# Altium footprint library TranDangKhoa-LIB.PcbLib: 1435 footprints (part 7 of 90)
Each footprint in its own frame and in the unit in brackets; x right, y up, seen from the top. Pads: shape width x height; smd on the part's side, far side on the other; paste and mask are expansions set on the pad; w line width, h text height; cw(c..) or ccw(c..) is an arc to the next point about the centre after c.
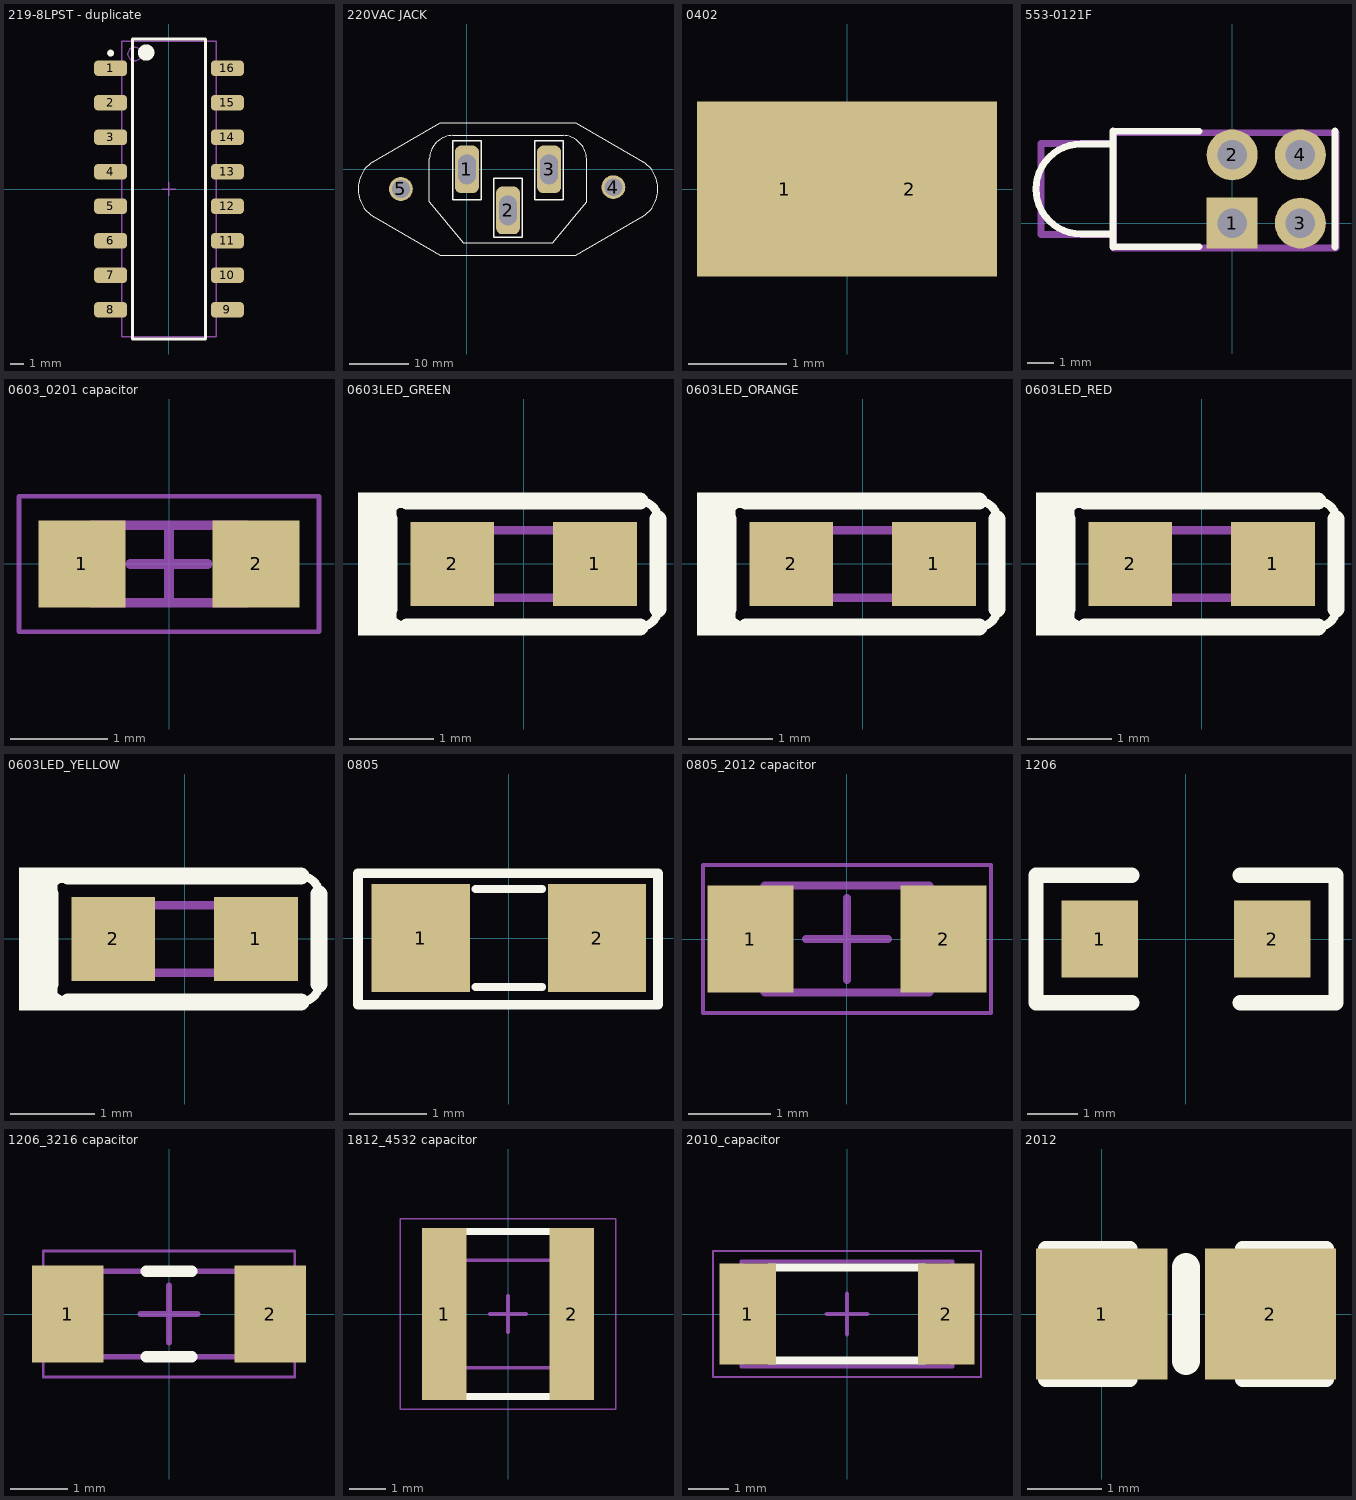
[diagram p6: the footprints below, top view; thin cyan lines are the x and y axes]

## 219-8LPST - duplicate [mm] "Surface Mount DIP Switch, 8-way, Gull Wing Leads"
height 3.85
pads (16):
  rrect50% 2.44x1.13 smd mask+0: 1(-4.3,8.89) 2(-4.3,6.35) 3(-4.3,3.81) 4(-4.3,1.27) 5(-4.3,-1.27) 6(-4.3,-3.81) 7(-4.3,-6.35) 8(-4.3,-8.89)
  rrect50% 2.44x1.13 smd: 9(4.3,-8.89) 10(4.3,-6.35) 11(4.3,-3.81) 12(4.3,-1.27) 13(4.3,1.27) 14(4.3,3.81) 15(4.3,6.35) 16(4.3,8.89)
Top Overlay:
  circle w0.25: c-4.3,10.005 r0.125
  circle w0.6: c-1.68,10.045 r0.3
  lines w0.2: -2.68,-11.045 -2.68,11.045 2.68,11.045 2.68,-11.045 -2.68,-11.045
Mechanical 13:
  circle w0.1: c-2.525,9.945 r0.5
  lines w0.1: -3.475,-10.895 -3.475,10.895 3.475,10.895 3.475,-10.895 -3.475,-10.895
Mechanical 15:
  lines w0.1: -0.5,0 0.5,0 ; 0,-0.5 0,0.5
3D body "dipswitch254.stp": height 3.37, standoff -0.14, extent -5.103,-11.404 5.08,11.404

## 220VAC JACK [mm]
pads (5):
  rrect50% 4x8 hole 3 slot 5 at 90 deg: 1(0,0) 2(6.903,-6.903) 3(13.807,0)
  round 4 hole 3: 4(24.612,-3.001) 5(-11.105,-3.302)
Top Overlay:
  lines w0.2: -15.923,-7.804 -4.486,-14.407 ; -15.923,1.201 -4.486,7.804 ; -15.908,-7.804 cw(c-12.887,-3.302) -15.908,1.201 ; -4.502,-14.407 18.309,-14.407 ; -4.502,7.804 18.309,7.804 ; 18.293,-14.406 29.73,-7.803 ; 18.293,7.804 29.73,1.201 ; 29.714,-7.804 ccw(c26.694,-3.302) 29.714,1.201 ; -6.303,-5.403 -6.303,1.801 cw(c-2.251,1.651) -2.401,5.703 16.208,5.703 cw(c15.997,1.59) 20.11,1.801 20.11,-5.403 14.407,-12.306 -0.6,-12.306 -6.303,-5.403
  lines w0.254: -2.401,-5.102 2.401,-5.102 2.401,4.802 -2.401,4.802 -2.401,-5.102 ; 4.502,-11.405 9.304,-11.405 9.304,-1.501 4.502,-1.501 4.502,-11.405 ; 11.405,-5.102 16.208,-5.102 16.208,4.802 11.405,4.802 11.405,-5.102

## 0402 [mil]
pads (2):
  rect 70x70 smd: 1(-25,0) 2(25,0)
Top Overlay:
  lines w4: -41.25,-9.25 -37,-13.5 41.25,-13.5 41.25,13.5 -37.5,13.5 -41.25,9.75 -41.25,-9.25

## 553-0121F [mm]
pads (4):
  rect 1.9x1.9 hole 1.1: 1(0,0)
  round 1.9 hole 1.1: 2(0,2.54) 3(2.54,0) 4(2.54,2.54)
Top Overlay:
  lines w0.254: -4.445,-0.889 -4.445,3.429 ; -4.445,-0.406 -5.639,-0.406 cw(c-5.639,1.27) -5.639,2.946 -4.445,2.946 ; -4.43,-0.88 -1.23,-0.88 ; -4.43,3.42 -1.23,3.42 ; 3.833,-0.889 3.833,3.429
Mechanical 16:
  lines w0.254: -4.43,-0.43 -7.13,-0.43 -7.13,2.97 -4.43,2.97 ; -4.43,-0.93 -4.43,3.37 3.87,3.37 3.87,-0.93 -4.43,-0.93
Mechanical 29:
  text ".Designator" at -2.5,0.5 h1.52
3D body "55307XXF.stp": height 9.65, standoff -3.68, extent -7.28,-0.898 3.718,3.42

## 0603_0201 capacitor [mm] "Chip Capacitor, 2-Leads, Body 1.60x0.80mm, IPC Medium Density"
height 0.8
pads (2):
  rect 0.9x0.9 smd: 1(-0.9,0) 2(0.9,0)
Mechanical 13:
  lines w0.1: -0.8,-0.4 -0.8,0.4 0.8,0.4 0.8,-0.4 -0.8,-0.4
Mechanical 15:
  lines w0.05: -1.55,-0.7 -1.55,0.7 1.55,0.7 1.55,-0.7 -1.55,-0.7
  lines w0.1: -0.4,0 0.4,0 ; 0,-0.4 0,0.4
3D body: height 0.8, standoff 0, extent -0.4,-0.4 0.4,0.4
3D body: height 0.8, standoff 0, extent -0.8,-0.4 -0.4,0.4
3D body: height 0.8, standoff 0, extent 0.4,-0.4 0.8,0.4

## 0603LED_GREEN [mm]
pads (2):
  rect 1x1 smd paste+0 mask+0: 1(0.85,0) 2(-0.85,0)
Top Overlay:
  rectangle: -1.782,0.665 -1.132,0.851
  rectangle: -1.973,-0.851 -1.516,0.851
  rectangle: -1.782,-0.851 -1.198,-0.686
  lines w0.102: -1.602,-0.533 ccw(c-1.386,-0.533) -1.386,-0.749 ; -1.602,0.533 cw(c-1.386,0.533) -1.386,0.749 ; 1.386,-0.749 ccw(c1.386,-0.533) 1.602,-0.533 ; 1.386,0.749 cw(c1.386,0.533) 1.602,0.533
  lines w0.203: -1.602,-0.533 -1.602,0.533 ; -1.386,-0.749 1.386,-0.749 ; -1.386,0.749 1.386,0.749 ; 1.602,-0.533 1.602,0.533
Mechanical 7:
  lines w0.1: -0.8,-0.4 0.8,-0.4 0.8,0.4 -0.8,0.4 -0.8,-0.4
  text ".Comment" at -1.6,-0.9 h0.4
  text ".Designator" at -1.6,0.6 h0.4
3D body: height 0.38, standoff 0, extent 0.664,-0.532 1.089,0.532
3D body: height 0.38, standoff 0, extent -0.925,-0.535 -0.5,0.535
3D body: height 0.38, standoff 0, extent -0.502,-0.533 0.668,0.533
3D body: height 0.46, standoff 0, extent -0.301,-0.464 0.493,0.402

## 0603LED_ORANGE [mm]
pads (2):
  rect 1x1 smd paste+0 mask+0: 1(0.85,0) 2(-0.85,0)
Top Overlay:
  rectangle: -1.782,-0.851 -1.198,-0.686
  rectangle: -1.973,-0.851 -1.516,0.851
  rectangle: -1.782,0.665 -1.132,0.851
  lines w0.102: -1.602,-0.533 ccw(c-1.386,-0.533) -1.386,-0.749 ; -1.602,0.533 cw(c-1.386,0.533) -1.386,0.749 ; 1.386,-0.749 ccw(c1.386,-0.533) 1.602,-0.533 ; 1.386,0.749 cw(c1.386,0.533) 1.602,0.533
  lines w0.203: -1.602,-0.533 -1.602,0.533 ; -1.386,-0.749 1.386,-0.749 ; -1.386,0.749 1.386,0.749 ; 1.602,-0.533 1.602,0.533
Mechanical 7:
  lines w0.1: -0.8,-0.4 0.8,-0.4 0.8,0.4 -0.8,0.4 -0.8,-0.4
  text ".Designator" at -1.6,0.6 h0.4
  text ".Comment" at -1.6,-0.9 h0.4
3D body: height 0.38, standoff 0, extent 0.664,-0.532 1.089,0.532
3D body: height 0.38, standoff 0, extent -0.925,-0.535 -0.5,0.535
3D body: height 0.38, standoff 0, extent -0.502,-0.533 0.668,0.533
3D body: height 0.46, standoff 0, extent -0.301,-0.464 0.493,0.402

## 0603LED_RED [mm]
pads (2):
  rect 1x1 smd paste+0 mask+0: 1(0.85,0) 2(-0.85,0)
Top Overlay:
  rectangle: -1.782,-0.851 -1.198,-0.686
  rectangle: -1.973,-0.851 -1.516,0.851
  rectangle: -1.782,0.665 -1.132,0.851
  lines w0.102: -1.602,-0.533 ccw(c-1.386,-0.533) -1.386,-0.749 ; -1.602,0.533 cw(c-1.386,0.533) -1.386,0.749 ; 1.386,-0.749 ccw(c1.386,-0.533) 1.602,-0.533 ; 1.386,0.749 cw(c1.386,0.533) 1.602,0.533
  lines w0.203: -1.602,-0.533 -1.602,0.533 ; -1.386,-0.749 1.386,-0.749 ; -1.386,0.749 1.386,0.749 ; 1.602,-0.533 1.602,0.533
Mechanical 7:
  lines w0.1: -0.8,-0.4 0.8,-0.4 0.8,0.4 -0.8,0.4 -0.8,-0.4
  text ".Designator" at -1.6,0.6 h0.4
  text ".Comment" at -1.6,-0.9 h0.4
3D body: height 0.38, standoff 0, extent 0.664,-0.532 1.089,0.532
3D body: height 0.38, standoff 0, extent -0.925,-0.535 -0.5,0.535
3D body: height 0.38, standoff 0, extent -0.502,-0.533 0.668,0.533
3D body: height 0.46, standoff 0, extent -0.301,-0.464 0.493,0.402

## 0603LED_YELLOW [mm]
pads (2):
  rect 1x1 smd paste+0 mask+0: 1(0.85,0) 2(-0.85,0)
Top Overlay:
  rectangle: -1.782,0.665 -1.132,0.851
  rectangle: -1.973,-0.851 -1.516,0.851
  rectangle: -1.782,-0.851 -1.198,-0.686
  lines w0.102: -1.602,-0.533 ccw(c-1.386,-0.533) -1.386,-0.749 ; -1.602,0.533 cw(c-1.386,0.533) -1.386,0.749 ; 1.386,-0.749 ccw(c1.386,-0.533) 1.602,-0.533 ; 1.386,0.749 cw(c1.386,0.533) 1.602,0.533
  lines w0.203: -1.602,-0.533 -1.602,0.533 ; -1.386,-0.749 1.386,-0.749 ; -1.386,0.749 1.386,0.749 ; 1.602,-0.533 1.602,0.533
Mechanical 7:
  lines w0.1: -0.8,-0.4 -0.8,0.4 0.8,0.4 0.8,-0.4 -0.8,-0.4
  text ".Comment" at -1.6,-0.9 h0.4
  text ".Designator" at -1.6,0.6 h0.4
3D body: height 0.46, standoff 0, extent -0.301,-0.464 0.493,0.402
3D body: height 0.38, standoff 0, extent -0.502,-0.533 0.668,0.533
3D body: height 0.38, standoff 0, extent -0.925,-0.535 -0.5,0.535
3D body: height 0.38, standoff 0, extent 0.664,-0.532 1.089,0.532

## 0805 [mil] "Compoment SMD 80x50mil"
height 50
pads (2):
  rect 50x55 smd: 1(-45,0) 2(45,0)
Top Overlay:
  lines w4: -17,-25 17,-25 ; -17,25 17,25
  lines w5: -77,-34 -77,33 76,33 76,-34 -77,-34
3D body "SW3dPS-smt_resistor_packages.STEP": height 24.02, standoff -0.39, extent -39.76,-27 39.77,23

## 0805_2012 capacitor [mm] "Chip Capacitor, 2-Leads, Body 2.00x1.30mm, IPC Medium Density"
height 0.8
pads (2):
  rect 1.05x1.3 smd: 1(-1.175,0) 2(1.175,0)
Mechanical 13:
  lines w0.1: -1,-0.65 1,-0.65 1,0.65 -1,0.65 -1,-0.65
Mechanical 15:
  lines w0.05: -1.75,-0.9 1.75,-0.9 1.75,0.9 -1.75,0.9 -1.75,-0.9
  lines w0.1: -0.5,0 0.5,0 ; 0,-0.5 0,0.5
3D body: height 0.8, standoff 0, extent 0.5,-0.65 1,0.65
3D body: height 0.8, standoff 0, extent -1,-0.65 -0.5,0.65
3D body: height 0.8, standoff 0, extent -0.5,-0.65 0.5,0.65

## 1206 [mil]
pads (2):
  rect 60x60 smd: 1(-67.5,0) 2(67.5,0)
Top Overlay:
  lines w12: -42.5,-50 -117.5,-50 -117.5,50 -42.5,50 ; 42.5,-50 117.5,-50 117.5,50 42.5,50

## 1206_3216 capacitor [mm] "Chip Capacitor, 2-Leads, Body 3.00x1.50mm, IPC Medium Density"
height 0.85
pads (2):
  rect 1.25x1.7 smd: 1(-1.775,0) 2(1.775,0)
Top Overlay:
  lines w0.2: -0.4,-0.75 0.4,-0.75 ; -0.4,0.75 0.4,0.75
Mechanical 13:
  lines w0.1: -1.5,-0.75 1.5,-0.75 1.5,0.75 -1.5,0.75 -1.5,-0.75
Mechanical 15:
  lines w0.05: -2.2,-1.1 2.2,-1.1 2.2,1.1 -2.2,1.1 -2.2,-1.1
  lines w0.1: -0.5,0 0.5,0 ; 0,-0.5 0,0.5
3D body: height 0.85, standoff 0, extent 1,-0.75 1.5,0.75
3D body: height 0.85, standoff 0, extent -1.5,-0.75 -1,0.75
3D body: height 0.85, standoff 0, extent -1,-0.75 1,0.75

## 1812_4532 capacitor [mm] "Chip Capacitor, 2-Leads, Body 4.60x3.00mm, IPC Medium Density"
height 1.5
pads (2):
  rect 1.25x4.8 smd: 1(-1.775,0) 2(1.775,0)
Top Overlay:
  lines w0.2: -1.2,-2.3 1.2,-2.3 ; -1.2,2.3 1.2,2.3
Mechanical 13:
  lines w0.1: -2.3,-1.5 2.3,-1.5 2.3,1.5 -2.3,1.5 -2.3,-1.5
Mechanical 15:
  lines w0.05: -3,-2.65 3,-2.65 3,2.65 -3,2.65 -3,-2.65
  lines w0.1: -0.5,0 0.5,0 ; 0,-0.5 0,0.5
3D body: height 1.5, standoff 0, extent 1.8,-1.5 2.3,1.5
3D body: height 1.5, standoff 0, extent -2.3,-1.5 -1.8,1.5
3D body: height 1.5, standoff 0, extent -1.8,-1.5 1.8,1.5

## 2010_capacitor [mm] "Chip Capacitor, 2-Leads, Body 5.20x2.60mm, IPC Medium Density"
height 1.5
pads (2):
  rect 1.4x2.5 smd: 1(-2.45,0) 2(2.45,0)
Top Overlay:
  lines w0.2: -1.9,-1.15 1.9,-1.15 ; -1.9,1.15 1.9,1.15
Mechanical 13:
  lines w0.1: -2.6,-1.3 2.6,-1.3 2.6,1.3 -2.6,1.3 -2.6,-1.3
Mechanical 15:
  lines w0.05: -3.3,-1.55 3.3,-1.55 3.3,1.55 -3.3,1.55 -3.3,-1.55
  lines w0.1: -0.5,0 0.5,0 ; 0,-0.5 0,0.5
3D body: height 1.5, standoff 0, extent 2.3,-1.3 2.6,1.3
3D body: height 1.5, standoff 0, extent -2.6,-1.3 -2.3,1.3
3D body: height 1.5, standoff 0, extent -2.3,-1.3 2.3,1.3

## 2012 [mil]
pads (2):
  rect 70x70 smd: 1(0,0) 2(90,0)
Top Overlay:
  lines w8: 15,-35 -30,-35 -30,35 15,35 ; 75,-35 120,-35 120,35 75,35
  lines w15: 45,-25 45,25